# Altium footprint library Connectors.PcbLib: 245 footprints (part 1 of 16)
Each footprint in its own frame and in the unit in brackets; x right, y up, seen from the top. Pads: shape width x height; smd on the part's side, far side on the other; paste and mask are expansions set on the pad; w line width, h text height; cw(c..) or ccw(c..) is an arc to the next point about the centre after c.
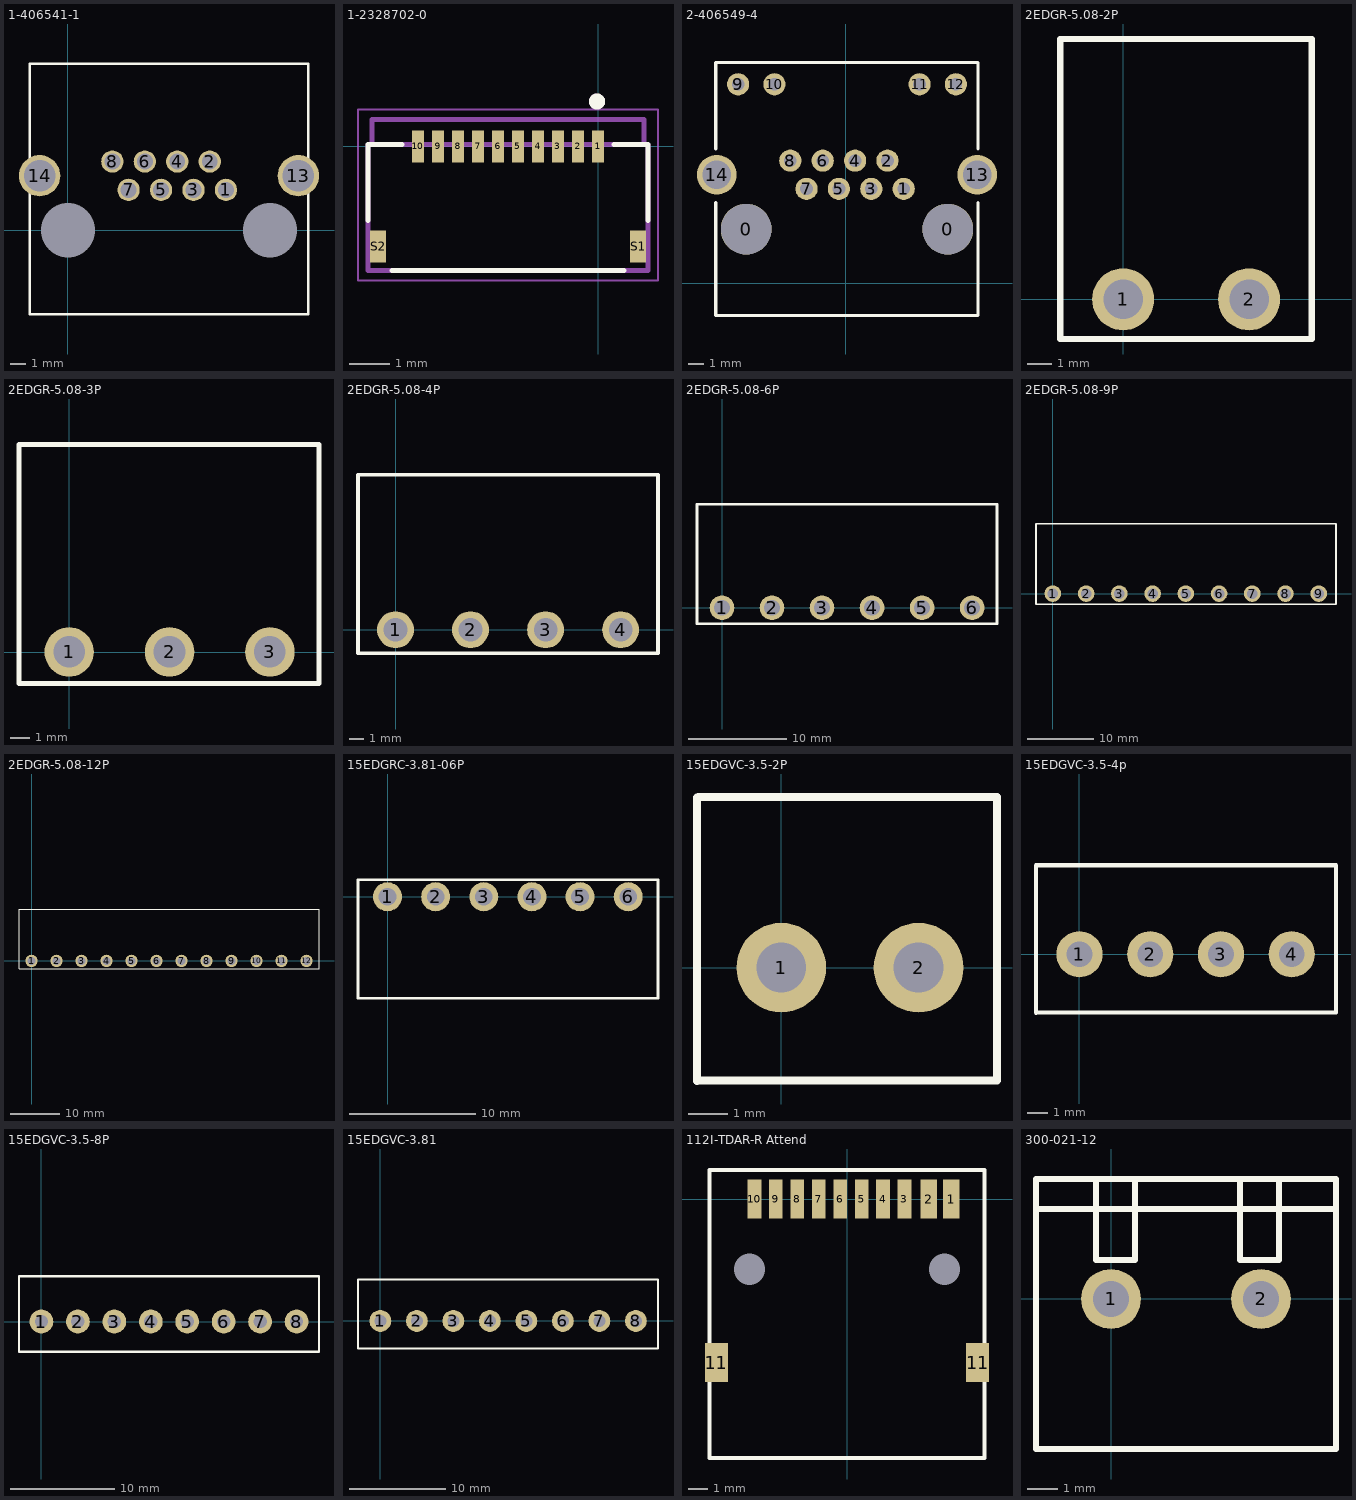
[diagram p0: the footprints below, top view; thin cyan lines are the x and y axes]

## 1-406541-1 [mm] "Розетка 8P8C (RJ45) на плату экранированная"
pads (12):
  round 1.4 hole 1 unplated: 1(9.93,2.54) 2(8.91,4.32) 3(7.89,2.54) 4(6.87,4.32) 5(5.85,2.54) 6(4.83,4.32) 7(3.81,2.54) 8(2.79,4.32)
  round 2.6 hole 2 unplated: 13(14.48,3.43) 14(-1.78,3.43)
  round 2.1 hole 3.4 unplated: ""(0,0) ""(12.7,0)
Top Overlay:
  lines w0.15: -2.4,-5.28 -2.4,10.2 -2.4,10.47 -1.9,10.47 15.1,10.47 15.1,10.2 15.1,-5.28 -2.4,-5.28
3D body "1775134-4.stp": height 14.59, standoff -3.86, extent -3.05,-5.35 15.85,10.4

## 1-2328702-0 [mm]
pads (12):
  rect 0.3x0.8 smd: 1(0,0) 2(-0.5,0) 3(-1,0) 4(-1.5,0) 5(-2,0) 6(-2.5,0) 7(-3,0) 8(-3.5,0) 9(-4,0) 10(-4.5,0)
  rect 0.4x0.8 smd: S1(1,-2.5) S2(-5.5,-2.5)
Top Overlay:
  circle w0.2: c-0.025,1.125 r0.1
  lines w0.127: -5.75,-1.85 -5.75,0.05 -4.9,0.05 ; -5.15,-3.1 0.65,-3.1 ; 0.4,0.05 1.25,0.05 1.25,-1.85
Mechanical 13:
  circle w0.2: c-0.025,1.125 r0.1
  lines w0.127: -5.65,0.05 -5.65,0.68 1.15,0.68 1.15,0.05 ; -5.65,0.05 1.15,0.05 ; -5.65,0.05 -5.75,0.05 -5.75,-3.1 1.25,-3.1 1.25,0.05 1.15,0.05
Mechanical 15:
  lines w0.05: -6,-3.35 1.5,-3.35 1.5,0.925 -6,0.925 -6,-3.35
3D body "c-1-2328702-0-a-3d.stp": height 1.06, standoff 0, extent -5.749,-3.067 1.251,0.765

## 2-406549-4 [mm] "INVERTED MODULAR JACK ASSEMBLY (TE)"
height 14
pads (16):
  round 3.2 hole 3.2: 0(-6.28,3.405) 0(6.42,3.405)
  round 1.4 hole 0.8: 1(3.64,5.945) 2(2.62,7.725) 3(1.6,5.945) 4(0.58,7.725) 5(-0.44,5.945) 6(-1.46,7.725) 7(-2.48,5.945) 8(-3.5,7.725) 9(-6.79,12.535) 10(-4.5,12.535) 11(4.64,12.535) 12(6.93,12.535)
  round 2.5 hole 1.8: 13(8.27,6.835) 14(-8.13,6.835)
Top Overlay:
  lines w0.2: -8.2,5.075 -8.2,-2.025 8.325,-2.025 8.325,5.075 ; -8.2,8.475 -8.2,13.85 ; -8.2,13.9 8.325,13.9 ; 8.325,8.475 8.325,13.85
3D body "c-2-406549-4-r-3d.stp": height 14.5, standoff -4.22, extent -9.297,-2.821 9.347,13.9

## 2EDGR-5.08-2P [mm]
pads (2):
  round 2.5 hole 1.6: 1(0,0) 2(5.08,0)
Top Overlay:
  lines w0.254: 7.611,-1.6 -2.54,-1.6 -2.54,10.5 7.611,10.5 ; 7.611,-1.591 7.611,0 7.611,10.485
3D body "User Library-5EHDR_1P.step": height 8.67, standoff -3.8, extent -2.53,-1.75 2.47,10.25
3D body "User Library-5EHDR_1P.step": height 8.67, standoff -3.8, extent 2.55,-1.75 7.55,10.25

## 2EDGR-5.08-3P [mm]
pads (3):
  round 2.5 hole 1.6: 1(0.007,0.007) 2(5.087,0.007) 3(10.167,0.007)
Top Overlay:
  lines w0.254: -2.533,-1.593 -2.533,10.507 12.651,10.507 12.651,-1.593 -2.533,-1.593
3D body "User Library-5EHDR_1P.step": height 8.67, standoff -3.8, extent 7.637,-1.743 12.637,10.257
3D body "User Library-5EHDR_1P.step": height 8.67, standoff -3.8, extent -2.523,-1.743 2.477,10.257
3D body "User Library-5EHDR_1P.step": height 8.67, standoff -3.8, extent 2.557,-1.743 7.557,10.257

## 2EDGR-5.08-4P [mm]
pads (4):
  round 2.5 hole 1.6: 1(0,0) 2(5.08,0) 3(10.16,0) 4(15.24,0)
Top Overlay:
  lines w0.254: 17.771,10.485 17.771,-1.6 -2.54,-1.6 -2.54,10.5 17.771,10.5
3D body "User Library-5EHDR_1P.step": height 8.67, standoff -3.8, extent 2.55,-1.75 7.55,10.25
3D body "User Library-5EHDR_1P.step": height 8.67, standoff -3.8, extent -2.53,-1.75 2.47,10.25
3D body "User Library-5EHDR_1P.step": height 8.67, standoff -3.8, extent 7.63,-1.75 12.63,10.25
3D body "User Library-5EHDR_1P.step": height 8.67, standoff -3.8, extent 12.71,-1.75 17.71,10.25

## 2EDGR-5.08-6P [mm]
pads (6):
  round 2.5 hole 1.6: 1(0,0) 2(5.08,0) 3(10.16,0) 4(15.24,0) 5(20.32,0) 6(25.4,0)
Top Overlay:
  lines w0.254: 27.88,-1.6 -2.54,-1.6 -2.54,10.5 27.931,10.5 ; 27.931,-1.6 27.931,10.485
3D body "User Library-5EHDR_1P.step": height 8.67, standoff -3.8, extent 22.87,-1.75 27.87,10.25
3D body "User Library-5EHDR_1P.step": height 8.67, standoff -3.8, extent 17.79,-1.75 22.79,10.25
3D body "User Library-5EHDR_1P.step": height 8.67, standoff -3.8, extent 2.55,-1.75 7.55,10.25
3D body "User Library-5EHDR_1P.step": height 8.67, standoff -3.8, extent -2.53,-1.75 2.47,10.25
3D body "User Library-5EHDR_1P.step": height 8.67, standoff -3.8, extent 7.63,-1.75 12.63,10.25
3D body "User Library-5EHDR_1P.step": height 8.67, standoff -3.8, extent 12.71,-1.75 17.71,10.25

## 2EDGR-5.08-9P [mm]
pads (9):
  round 2.5 hole 1.6: 1(0,0) 2(5,0) 3(10,0) 4(15,0) 5(20,0) 6(25,0) 7(30,0) 8(35,0) 9(40,0)
Top Overlay:
  lines w0.254: -2.54,-1.6 -2.54,10.5 42.6,10.5 42.6,-1.6 -2.54,-1.6
3D body "User Library-5EHDR_1P.step": height 8.67, standoff -3.8, extent -2.5,-1.6 2.5,10.4
3D body "User Library-5EHDR_1P.step": height 8.67, standoff -3.8, extent 2.5,-1.6 7.5,10.4
3D body "User Library-5EHDR_1P.step": height 8.67, standoff -3.8, extent 7.5,-1.6 12.5,10.4
3D body "User Library-5EHDR_1P.step": height 8.67, standoff -3.8, extent 12.5,-1.6 17.5,10.4
3D body "User Library-5EHDR_1P.step": height 8.67, standoff -3.8, extent 17.5,-1.6 22.5,10.4
3D body "User Library-5EHDR_1P.step": height 8.67, standoff -3.8, extent 22.5,-1.6 27.5,10.4
3D body "User Library-5EHDR_1P.step": height 8.67, standoff -3.8, extent 27.5,-1.6 32.5,10.4
3D body "User Library-5EHDR_1P.step": height 8.67, standoff -3.8, extent 32.5,-1.6 37.5,10.4
3D body "User Library-5EHDR_1P.step": height 8.67, standoff -3.8, extent 37.5,-1.6 42.5,10.4

## 2EDGR-5.08-12P [mm]
pads (12):
  round 2.5 hole 1.6: 1(0,0) 2(5.08,0) 3(10.16,0) 4(15.24,0) 5(20.32,0) 6(25.4,0) 7(30.48,0) 8(35.56,0) 9(40.64,0) 10(45.72,0) 11(50.8,0) 12(55.88,0)
Top Overlay:
  lines w0.254: -2.54,-1.6 58.42,-1.6 58.42,10.5 -2.54,10.5 -2.54,-1.6
3D body "User Library-5EHDR_1P.step": height 8.67, standoff -3.8, extent 53.35,-1.75 58.35,10.25
3D body "User Library-5EHDR_1P.step": height 8.67, standoff -3.8, extent 48.27,-1.75 53.27,10.25
3D body "User Library-5EHDR_1P.step": height 8.67, standoff -3.8, extent 33.03,-1.75 38.03,10.25
3D body "User Library-5EHDR_1P.step": height 8.67, standoff -3.8, extent 27.95,-1.75 32.95,10.25
3D body "User Library-5EHDR_1P.step": height 8.67, standoff -3.8, extent 38.11,-1.75 43.11,10.25
3D body "User Library-5EHDR_1P.step": height 8.67, standoff -3.8, extent 43.19,-1.75 48.19,10.25
3D body "User Library-5EHDR_1P.step": height 8.67, standoff -3.8, extent 22.87,-1.75 27.87,10.25
3D body "User Library-5EHDR_1P.step": height 8.67, standoff -3.8, extent 17.79,-1.75 22.79,10.25
3D body "User Library-5EHDR_1P.step": height 8.67, standoff -3.8, extent 2.55,-1.75 7.55,10.25
3D body "User Library-5EHDR_1P.step": height 8.67, standoff -3.8, extent -2.53,-1.75 2.47,10.25
3D body "User Library-5EHDR_1P.step": height 8.67, standoff -3.8, extent 7.63,-1.75 12.63,10.25
3D body "User Library-5EHDR_1P.step": height 8.67, standoff -3.8, extent 12.71,-1.75 17.71,10.25

## 15EDGRC-3.81-06P [mm]
height 9.1
pads (6):
  round 2.3 hole 1.4: 1(0,0) 2(3.81,0) 3(7.62,0) 4(11.43,0) 5(15.24,0) 6(19.05,0)
Top Overlay:
  lines w0.203: -2.337,-8.02 -2.337,1.331 21.408,1.331 21.408,-8.02 -2.337,-8.02
3D body "1897843.stp": height 7.1, standoff -3.4, extent -2.587,-9.016 21.663,1.784

## 15EDGVC-3.5-2P [mil]
pads (2):
  round 90 hole 50: 1(0,0) 2(137.8,0)
Top Overlay:
  lines w8: -84.65,-114 -84.65,171 ; -83.6,-113.39 216.54,-113.39 ; -83.2,171.26 216.54,171.26 ; 216.54,-113.52 216.54,171.48
3D body "User Library-kf2edgv-3-5-2p.STEP": height 393.7, standoff -114.17, extent -84.65,-111.42 218.5,172.05

## 15EDGVC-3.5-4p [mil]
pads (4):
  round 90 hole 50: 1(0,0) 2(137.8,0) 3(275.59,0) 4(413.39,0)
Top Overlay:
  lines w8: -84.65,-114 -84.65,173.23 499.61,173.23 499.61,-113.39 -83.6,-113.39
3D body "User Library-kf2edgv-3-5-2p.STEP": height 393.7, standoff -114.17, extent 198.43,-110.62 501.58,172.84
3D body "User Library-kf2edgv-3-5-2p.STEP": height 393.7, standoff -114.17, extent -84.65,-111.42 218.5,172.05

## 15EDGVC-3.5-8P [mil]
height 358.27
pads (8):
  round 90 hole 50: 1(0,0) 2(137.8,0) 3(275.59,0) 4(413.39,0) 5(551.18,0) 6(688.98,0) 7(826.77,0) 8(964.57,0)
Top Overlay:
  lines w8: -84.65,-114 1049.21,-114 1049.21,171 -84.65,171 -84.65,-114

## 15EDGVC-3.81 [mil]
height 358.27
pads (8):
  round 90 hole 50: 1(0,0) 2(150,0) 3(300,0) 4(450,0) 5(600,0) 6(750,0) 7(900,0) 8(1050,0)
Top Overlay:
  lines w8: -92,-114 -92,171 1141,171 1141,-114 -92,-114
3D body "User Library-ECH381V-08P.STEP": height 362.2, standoff -133.86, extent -91.1,-113.46 1140,170

## 112I-TDAR-R Attend [mm]
pads (14):
  rect 0.85x2 smd: 1(5.35,0) 2(4.2,0)
  rect 0.7x2 smd: 3(2.95,0) 4(1.85,0) 5(0.75,0) 6(-0.35,0) 7(-1.45,0) 8(-2.55,0) 9(-3.65,0) 10(-4.75,0)
  rect 1.2x2 smd: 11(-6.7,-8.4) 11(6.7,-8.4)
  round 1.5 hole 1.6 unplated: ""(-5,-3.6) ""(5,-3.6)
Top Overlay:
  lines w0.2: -7.05,-13.3 7.05,-13.3 7.05,1.5 -7.05,1.5 -7.05,-13.3
3D body "112I-TXAR-R_C_1.STEP": height 2, standoff -0.55, extent -7.05,-13.182 7.05,0.1

## 300-021-12 [mm]
pads (2):
  round 2 hole 1.2: 1(0,0) 2(5,0)
Top Overlay:
  lines w0.2: -2.5,3 7.5,3 ; -0.5,4 -0.5,1.3 0.8,1.3 0.8,4 ; 4.3,3.9 4.3,1.3 5.6,1.3 5.6,3.9 ; -2.5,-5 -2.5,4 7.5,4 7.5,-5 -2.5,-5
3D body "TB-2_metric214.STEP": height 10.1, standoff -4, extent -2.45,-3.83 7.55,3.77